# Altium footprint library IC.PcbLib: 220 footprints (part 7 of 14)
Each footprint in its own frame and in the unit in brackets; x right, y up, seen from the top. Pads: shape width x height; smd on the part's side, far side on the other; paste and mask are expansions set on the pad; w line width, h text height; cw(c..) or ccw(c..) is an arc to the next point about the centre after c.
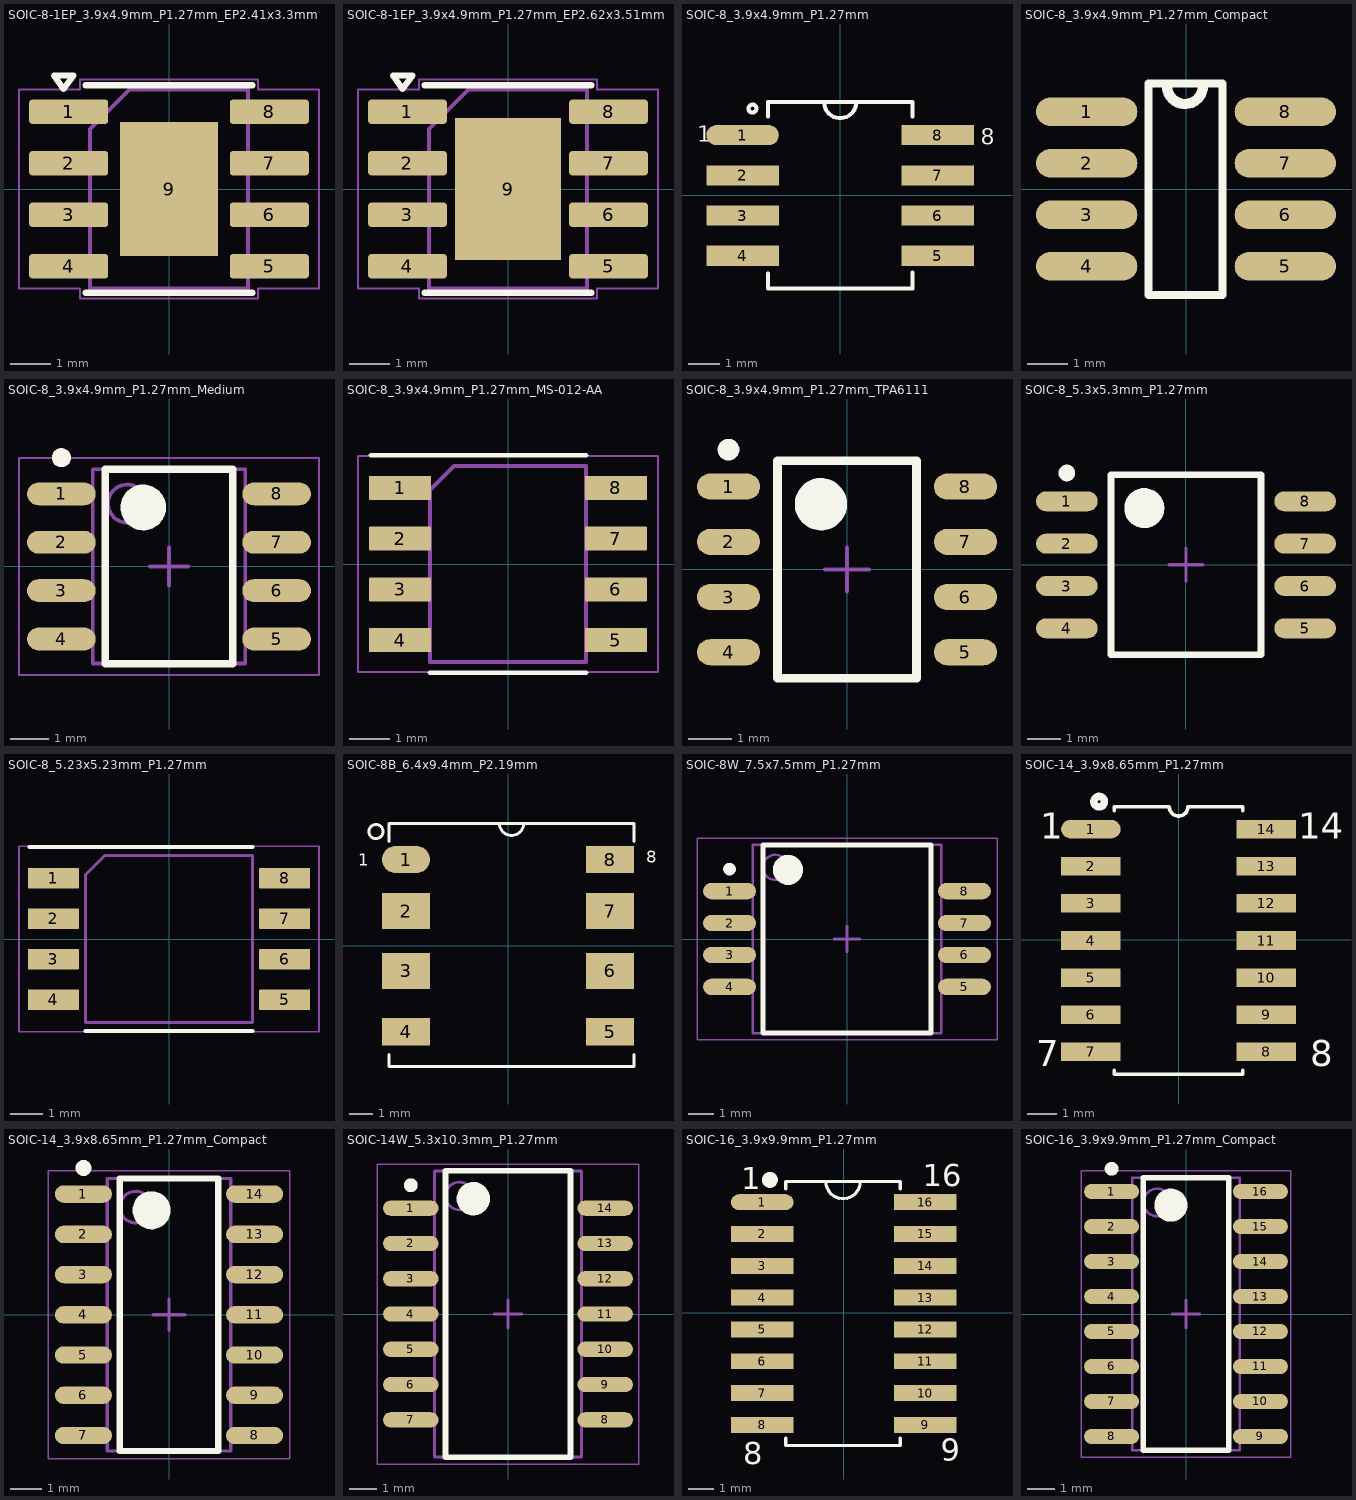
[diagram p6: the footprints below, top view; thin cyan lines are the x and y axes]

## SOIC-8-1EP_3.9x4.9mm_P1.27mm_EP2.41x3.3mm [mm] "IP5306, Power-bank Li-ion charger and 5 V boost converter — IC sạc pin dự phòng Li-ion và tăng áp 5 V [IC sac pin du phong Li-ion va tang ap 5 V]"
height 1.5
pads (9):
  rrect25% 1.95x0.6 smd: 1(-2.475,1.905) 2(-2.475,0.635) 3(-2.475,-0.635) 4(-2.475,-1.905) 5(2.475,-1.905) 6(2.475,-0.635) 7(2.475,0.635) 8(2.475,1.905)
  rect 2.41x3.3 smd paste-3.3: 9(0,0)
Top Overlay:
  lines w0.15: -2.06,-2.56 2.06,-2.56 ; -2.06,2.56 2.06,2.56 ; -2.84,2.8 -2.6,2.47 -2.36,2.8 -2.84,2.8
Top Paste:
  region: -1.085,0.16 -0.115,0.16 -0.115,1.49 -1.085,1.49
  region: -1.085,-1.49 -0.115,-1.49 -0.115,-0.16 -1.085,-0.16
  region: 0.115,0.16 1.085,0.16 1.085,1.49 0.115,1.49
  region: 0.115,-1.49 1.085,-1.49 1.085,-0.16 0.115,-0.16
Mechanical 2:
  lines w0.1: -1.95,-2.45 1.95,-2.45 1.95,2.45 -0.975,2.45 -1.95,1.475 -1.95,-2.45
Mechanical 4:
  lines w0.05: -3.7,-2.46 -3.7,2.46 -2.2,2.46 -2.2,2.7 2.2,2.7 2.2,2.46 3.7,2.46 3.7,-2.46 2.2,-2.46 2.2,-2.7 -2.2,-2.7 -2.2,-2.46 -3.7,-2.46
3D body "SOIC-8-1EP_3.9x4.9mm_P1.27mm_EP2.41x3.3mm.step": height 0, standoff 0, extent -3.45,-2.205 3.45,2.205

## SOIC-8-1EP_3.9x4.9mm_P1.27mm_EP2.62x3.51mm [mm] "MP1584EN, 3 A step-down switching regulator — IC nguồn xung giảm áp 3 A [IC nguon xung giam ap 3 A]"
height 1.5
pads (9):
  rrect25% 1.94x0.6 smd: 1(-2.48,1.905) 2(-2.48,0.635) 3(-2.48,-0.635) 4(-2.48,-1.905) 5(2.48,-1.905) 6(2.48,-0.635) 7(2.48,0.635) 8(2.48,1.905)
  rect 2.62x3.51 smd paste-3.51: 9(0,0)
Top Overlay:
  lines w0.15: -2.06,-2.56 2.06,-2.56 ; -2.06,2.56 2.06,2.56 ; -2.84,2.8 -2.6,2.47 -2.36,2.8 -2.84,2.8
Top Paste:
  region: -1.185,0.17 -0.125,0.17 -0.125,1.58 -1.185,1.58
  region: -1.185,-1.58 -0.125,-1.58 -0.125,-0.17 -1.185,-0.17
  region: 0.125,0.17 1.185,0.17 1.185,1.58 0.125,1.58
  region: 0.125,-1.58 1.185,-1.58 1.185,-0.17 0.125,-0.17
Mechanical 2:
  lines w0.1: -1.95,-2.45 1.95,-2.45 1.95,2.45 -0.975,2.45 -1.95,1.475 -1.95,-2.45
Mechanical 4:
  lines w0.05: -3.7,-2.46 -3.7,2.46 -2.2,2.46 -2.2,2.7 2.2,2.7 2.2,2.46 3.7,2.46 3.7,-2.46 2.2,-2.46 2.2,-2.7 -2.2,-2.7 -2.2,-2.46 -3.7,-2.46
3D body "SOIC-8-1EP_3.9x4.9mm_P1.27mm_EP2.62x3.51mm.step": height 0, standoff 0, extent -3.45,-2.205 3.45,2.205

## SOIC-8_3.9x4.9mm_P1.27mm [mil] "SOIC-8 narrow (150mil), body 3.9x4.9mm, pitch 1.27mm, span 6.16mm"
height 68.9
pads (8):
  oval 90x25 smd mask+3: 1(-121.32,75)
  rect 90x25 smd mask+3: 2(-121.32,25) 3(-121.32,-25) 4(-121.32,-75) 5(121.32,-75) 6(121.32,-25) 7(121.32,25) 8(121.32,75)
Top Overlay:
  circle w5: c-109,108 r4.92
  lines w5: -90,-97 -90,-116 90,-116 90,-96 ; -90,98 -90,116 90,116 90,98 ; -20,116 ccw(c0,116) 20,116
  text "8" at 175,63 h20
  text "1" at -178,67 h20
3D body "SOIC08 narrow.stp": height 78.74, standoff 0.13, extent -121.32,-98.42 121.32,98.43

## SOIC-8_3.9x4.9mm_P1.27mm_Compact [mm] "SOIC-8 narrow (150mil), body 3.9x4.9mm, pitch 1.27mm, span 4.90mm"
height 1.75
pads (8):
  oval 2.5x0.7 smd: 1(-2.45,1.905) 2(-2.45,0.635) 3(-2.45,-0.635) 4(-2.45,-1.905) 5(2.45,-1.905) 6(2.45,-0.635) 7(2.45,0.635) 8(2.45,1.905)
Top Overlay:
  lines w0.2: -0.925,-2.616 0.9,-2.616 0.9,2.6 -0.925,2.6 -0.925,-2.616
  lines w0.254: -0.466,2.489 ccw(c-0.025,2.54) 0.418,2.54
3D body "SO-8.STEP": height 1.5, standoff 0, extent -2.76,-2.45 3.268,2.45

## SOIC-8_3.9x4.9mm_P1.27mm_Medium [mm] "SOIC-8 narrow (150mil), body 3.9x4.9mm, pitch 1.27mm, span 5.65mm"
pads (8):
  oval 1.8x0.6 smd: 1(-2.825,1.905) 2(-2.825,0.635) 3(-2.825,-0.635) 4(-2.825,-1.905) 5(2.825,-1.905) 6(2.825,-0.635) 7(2.825,0.635) 8(2.825,1.905)
Top Overlay:
  circle w0.6: c-0.675,1.55 r0.3
  circle w0.25: c-2.825,2.855 r0.125
  lines w0.2: -1.675,-2.55 1.675,-2.55 1.675,2.55 -1.675,2.55 -1.675,-2.55
Mechanical 13:
  circle w0.1: c-1.1,1.65 r0.5
  lines w0.1: -2,-2.55 2,-2.55 2,2.55 -2,2.55 -2,-2.55
Mechanical 15:
  lines w0.05: -3.937,-2.85 3.937,-2.85 3.937,2.85 -3.937,2.85 -3.937,-2.85
  lines w0.1: -0.5,0 0.5,0 ; 0,-0.5 0,0.5
3D body "CircuitWorks-SO-8 (PIC12FXXX).step": height 1.6, standoff 0, extent -2.995,-2.45 2.995,2.45

## SOIC-8_3.9x4.9mm_P1.27mm_MS-012-AA [mm] "8-lead IC package, 3.9 × 4.9 mm, 1.27 mm pitch — Vỏ IC 8 chân, thân 3.9 × 4.9 mm, bước chân 1.27 mm [Vo IC 8 chan, than 3.9 × 4.9 mm, buoc chan 1.27 mm]"
height 1.65
pads (8):
  rrect8% 1.55x0.6 smd: 1(-2.7,1.905) 2(-2.7,0.635) 3(-2.7,-0.635) 4(-2.7,-1.905) 5(2.7,-1.905) 6(2.7,-0.635) 7(2.7,0.635) 8(2.7,1.905)
Top Overlay:
  lines w0.12: -3.425,2.72 1.95,2.72 ; -1.95,-2.72 1.95,-2.72
  text ".Designator" at -1.95,2.9 h1
Mechanical 2:
  lines w0.1: -1.95,-2.45 1.95,-2.45 1.95,2.45 -1.35,2.45 -1.95,1.85 -1.95,-2.45
Mechanical 4:
  lines w0.05: -3.75,-2.7 3.75,-2.7 3.75,2.7 -3.75,2.7 -3.75,-2.7
3D body "SOIC-8_3.9x4.9mm_P1.27mm_MS-012-AA.step": height 0, standoff 0, extent -3.475,-2.205 3.475,2.205

## SOIC-8_3.9x4.9mm_P1.27mm_TPA6111 [mm] "SOIC-8 narrow (150mil), body 3.9x4.9mm, pitch 1.27mm, span 5.45mm (TPA6111)"
height 1.75
pads (8):
  oval 1.45x0.6 smd: 1(-2.725,1.905) 2(-2.725,0.635) 3(-2.725,-0.635) 4(-2.725,-1.905) 5(2.725,-1.905) 6(2.725,-0.635) 7(2.725,0.635) 8(2.725,1.905)
Top Overlay:
  circle w0.25: c-2.725,2.755 r0.125
  circle w0.6: c-0.6,1.5 r0.3
  lines w0.2: -1.6,-2.5 -1.6,2.5 1.6,2.5 1.6,-2.5 -1.6,-2.5
Mechanical 15:
  lines w0.1: -0.5,0 0.5,0 ; 0,-0.5 0,0.5
3D body "User Library-so8-3.STEP": height 1.7, standoff 0, extent -2.952,-2.36 3.048,2.54

## SOIC-8_5.3x5.3mm_P1.27mm [mm] "SOIC-8 medium (208mil), body 5.3x5.3mm, pitch 1.27mm (SPI flash)"
height 2.65
pads (8):
  oval 1.85x0.6 smd: 1(-3.575,1.905) 2(-3.575,0.635) 3(-3.575,-0.635) 4(-3.575,-1.905) 5(3.575,-1.905) 6(3.575,-0.635) 7(3.575,0.635) 8(3.575,1.905)
Top Overlay:
  circle w0.25: c-3.575,2.755 r0.125
  circle w0.6: c-1.25,1.7 r0.3
  lines w0.2: -2.25,-2.7 -2.25,2.7 2.25,2.7 2.25,-2.7 -2.25,-2.7
Mechanical 15:
  lines w0.1: -0.5,0 0.5,0 ; 0,-0.5 0,0.5
3D body "User Library-SOIC-8-208.STEP": height 2.2, standoff 0.05, extent -4.1,-2.7 4.1,2.7

## SOIC-8_5.23x5.23mm_P1.27mm [mm] "W25Q128JVSIQ, 128 Mbit (16 MiB) Quad SPI NOR flash, 2.7–3.6 V — Bộ nhớ NOR Flash Quad SPI 128 Mbit (16 MiB), 2,7–3,6 V [Bo nho NOR Flash Quad SPI 128 Mbit (16 MiB), 2,7–3,6 V]"
height 1.95
pads (8):
  rrect8% 1.6x0.65 smd: 1(-3.625,1.905) 2(-3.625,0.635) 3(-3.625,-0.635) 4(-3.625,-1.905) 5(3.625,-1.905) 6(3.625,-0.635) 7(3.625,0.635) 8(3.625,1.905)
Top Overlay:
  lines w0.12: -4.375,2.885 2.615,2.885 ; -2.615,-2.885 2.615,-2.885
  text ".Designator" at -2.615,3.1 h1
Mechanical 2:
  lines w0.1: -2.615,-2.615 2.615,-2.615 2.615,2.615 -2.015,2.615 -2.615,2.015 -2.615,-2.615
Mechanical 4:
  lines w0.05: -4.7,-2.9 4.7,-2.9 4.7,2.9 -4.7,2.9 -4.7,-2.9
3D body "SOIC-8_5.23x5.23mm_P1.27mm.step": height 0, standoff 0, extent -4.425,-2.23 4.425,2.23

## SOIC-8B_6.4x9.4mm_P2.19mm [mil] "SMD-8B 7-pin (SOIC-8 missing pin 6) power IC package, pitch 2.19mm"
height 144.88
pads (8):
  oval 80x45.67 smd mask+3: 1(-170,143.43)
  rect 80x59.84 smd mask+3: 2(-170,57.36) 3(-170,-42.4) 6(170,-42.4) 7(170,57.36)
  rect 80x45.67 smd mask+3: 4(-170,-143.43) 5(170,-143.43) 8(170,143.43)
Top Overlay:
  circle w5: c-220,190 r11.81
  lines w5: -198.19,-181.57 -198.19,-201.57 210,-201.57 210,-181.58 ; -198.19,173.43 -198.19,203.43 210,203.43 210,173.43 ; -14.09,203.43 ccw(c5.91,203.43) 25.91,203.43
  text "1" at -250,133.43 h20
  text "8" at 230,138.43 h20
3D body "User Library-SMD-8B.step": height 165.67, standoff 8.19, extent -187.91,-191.57 197.91,196.22

## SOIC-8W_7.5x7.5mm_P1.27mm [mm] "SOIC-8 wide (300mil), body 7.5x7.5mm, pitch 1.27mm"
height 1.5
pads (8):
  oval 2.1x0.65 smd: 1(-4.675,1.905) 2(-4.675,0.635) 3(-4.675,-0.635) 4(-4.675,-1.905) 5(4.675,-1.905) 6(4.675,-0.635) 7(4.675,0.635) 8(4.675,1.905)
Top Overlay:
  circle w0.25: c-4.675,2.78 r0.125
  circle w0.6: c-2.35,2.75 r0.3
  lines w0.2: -3.35,-3.75 -3.35,3.75 3.35,3.75 3.35,-3.75 -3.35,-3.75
Mechanical 13:
  circle w0.1: c-2.85,2.85 r0.5
  lines w0.1: -3.75,-3.75 -3.75,3.75 3.75,3.75 3.75,-3.75 -3.75,-3.75
Mechanical 15:
  lines w0.05: -5.969,-4 -5.969,4 5.969,4 5.969,-4 -5.969,-4
  lines w0.1: -0.5,0 0.5,0 ; 0,-0.5 0,0.5
3D body "SOIC127P1000X150-8N.step": height 1.5, standoff 0, extent -5,-3.65 5,3.65

## SOIC-14_3.9x8.65mm_P1.27mm [mil] "SOIC-14 narrow (150mil), body 3.9x8.65mm, pitch 1.27mm, span 6.0mm"
height 104.33
pads (14):
  oval 80x25 smd: 1(-118.11,149.01)
  rect 80x25 smd: 2(-118.11,99.01) 3(-118.11,49.01) 4(-118.11,-0.99) 5(-118.11,-50.99) 6(-118.11,-100.99) 7(-118.11,-150.99) 8(118.11,-150.99) 9(118.11,-100.99) 10(118.11,-50.99) 11(118.11,-0.99) 12(118.11,49.01) 13(118.11,99.01) 14(118.11,149.01)
Top Overlay:
  circle w10: c-107,186 r7.07
  lines w5: -86.51,-175.99 -86.51,-180.99 85.99,-180.99 ; -86.51,174.01 -86.51,179.01 ; -85.01,179.01 -13.01,179.01 ; -12.51,179.01 ccw(c-0.01,179.01) 12.49,179.01 ; 12.99,179.01 85.99,179.01 ; 86.49,-180.99 86.49,-175.99 ; 86.49,174.01 86.49,179.01
  text "1" at -186.01,136.01 h35
  text "14" at 160.99,136.01 h35
  text "7" at -192.01,-169.99 h35
  text "8" at 176.99,-169.99 h35
3D body "SOIC127P620X265-14N.step": height 104.33, standoff 0, extent -120,-169.29 122.13,169.29
3D body "so14-1.step": height 65.93, standoff -1, extent -118.11,-174.21 118.11,172.25

## SOIC-14_3.9x8.65mm_P1.27mm_Compact [mm] "SOIC-14 narrow (150mil), body 3.9x8.65mm, pitch 1.27mm, span 5.4mm"
height 1.75
pads (14):
  oval 1.8x0.55 smd: 1(-2.7,3.81) 2(-2.7,2.54) 3(-2.7,1.27) 4(-2.7,0) 5(-2.7,-1.27) 6(-2.7,-2.54) 7(-2.7,-3.81) 8(2.7,-3.81) 9(2.7,-2.54) 10(2.7,-1.27) 11(2.7,0) 12(2.7,1.27) 13(2.7,2.54) 14(2.7,3.81)
Top Overlay:
  circle w0.6: c-0.55,3.3 r0.3
  circle w0.25: c-2.7,4.635 r0.125
  lines w0.2: -1.55,-4.3 1.55,-4.3 1.55,4.3 -1.55,4.3 -1.55,-4.3
Mechanical 13:
  circle w0.1: c-1.05,3.4 r0.5
  lines w0.1: -1.95,-4.3 1.95,-4.3 1.95,4.3 -1.95,4.3 -1.95,-4.3
Mechanical 15:
  lines w0.05: -3.81,-4.55 3.81,-4.55 3.81,4.55 -3.81,4.55 -3.81,-4.55
  lines w0.1: -0.5,0 0.5,0 ; 0,-0.5 0,0.5
3D body "SOIC127P600X175-14N.step": height 1.75, standoff 0, extent -2.873,-4.3 3.127,4.3

## SOIC-14W_5.3x10.3mm_P1.27mm [mm] "SOIC-14 wide, body 5.3x10.3mm, pitch 1.27mm"
height 2
pads (14):
  oval 2x0.55 smd: 1(-3.5,3.81) 2(-3.5,2.54) 3(-3.5,1.27) 4(-3.5,0) 5(-3.5,-1.27) 6(-3.5,-2.54) 7(-3.5,-3.81) 8(3.5,-3.81) 9(3.5,-2.54) 10(3.5,-1.27) 11(3.5,0) 12(3.5,1.27) 13(3.5,2.54) 14(3.5,3.81)
Top Overlay:
  circle w0.25: c-3.5,4.635 r0.125
  circle w0.6: c-1.25,4.15 r0.3
  lines w0.2: -2.25,-5.15 -2.25,5.15 2.25,5.15 2.25,-5.15 -2.25,-5.15
Mechanical 13:
  circle w0.1: c-1.75,4.25 r0.5
  lines w0.1: -2.65,-5.15 -2.65,5.15 2.65,5.15 2.65,-5.15 -2.65,-5.15
Mechanical 15:
  lines w0.05: -4.699,-5.4 -4.699,5.4 4.699,5.4 4.699,-5.4 -4.699,-5.4
  lines w0.1: -0.5,0 0.5,0 ; 0,-0.5 0,0.5
3D body "SOIC127P760X150-14N.step": height 1.5, standoff 0, extent -3.81,-5.15 3.81,5.15

## SOIC-16_3.9x9.9mm_P1.27mm [mm] "SOIC-16 narrow (150mil), body 3.9x9.9mm, pitch 1.27mm, span 6.5mm"
pads (16):
  oval 2.5x0.635 smd mask+0.076: 1(-3.25,4.42)
  rect 2.5x0.635 smd mask+0.076: 2(-3.25,3.15) 3(-3.25,1.88) 4(-3.25,0.61) 5(-3.25,-0.66) 6(-3.25,-1.93) 7(-3.25,-3.2) 8(-3.25,-4.47) 9(3.25,-4.47) 10(3.25,-3.2) 11(3.25,-1.93) 12(3.25,-0.66) 13(3.25,0.61) 14(3.25,1.88) 15(3.25,3.15) 16(3.25,4.42)
Top Overlay:
  circle w0.381: c-2.946,5.309 r0.127
  lines w0.127: -2.311,-5.003 -2.311,-5.295 2.261,-5.295 2.261,-5.003 ; -2.311,4.953 -2.311,5.246 2.261,5.246 2.261,4.953 ; -0.712,5.246 ccw(c-0.025,5.246) 0.662,5.246
  text "1" at -4.089,4.928 h0.89
  text "8" at -4.016,-6.032 h0.89
  text "9" at 3.878,-5.909 h0.89
  text "16" at 3.15,5.055 h0.89
3D body "SOIC-16-1.step": height 1.4, standoff 0, extent -3.025,-4.975 2.975,4.925

## SOIC-16_3.9x9.9mm_P1.27mm_Compact [mm] "SOIC-16 narrow (150mil), body 3.9x9.9mm, pitch 1.27mm, span 5.4mm"
height 1.75
pads (16):
  oval 2x0.55 smd: 1(-2.7,4.445) 2(-2.7,3.175) 3(-2.7,1.905) 4(-2.7,0.635) 5(-2.7,-0.635) 6(-2.7,-1.905) 7(-2.7,-3.175) 8(-2.7,-4.445) 9(2.7,-4.445) 10(2.7,-3.175) 11(2.7,-1.905) 12(2.7,-0.635) 13(2.7,0.635) 14(2.7,1.905) 15(2.7,3.175) 16(2.7,4.445)
Top Overlay:
  circle w0.25: c-2.7,5.27 r0.125
  circle w0.6: c-0.55,3.95 r0.3
  lines w0.2: -1.55,-4.95 -1.55,4.95 1.55,4.95 1.55,-4.95 -1.55,-4.95
Mechanical 13:
  circle w0.1: c-1.05,4.05 r0.5
  lines w0.1: -1.95,-4.95 -1.95,4.95 1.95,4.95 1.95,-4.95 -1.95,-4.95
Mechanical 15:
  lines w0.05: -3.81,-5.2 -3.81,5.2 3.81,5.2 3.81,-5.2 -3.81,-5.2
  lines w0.1: -0.5,0 0.5,0 ; 0,-0.5 0,0.5
3D body "User Library-SOIC-16-1.step": height 1.4, standoff 0, extent -3,-4.95 3,4.95